# Altium footprint library Package_DFN_QFN.PcbLib: 557 footprints (part 35 of 35)
Each footprint in its own frame and in the unit in brackets; x right, y up, seen from the top. Pads: shape width x height; smd on the part's side, far side on the other; paste and mask are expansions set on the pad; w line width, h text height; cw(c..) or ccw(c..) is an arc to the next point about the centre after c.
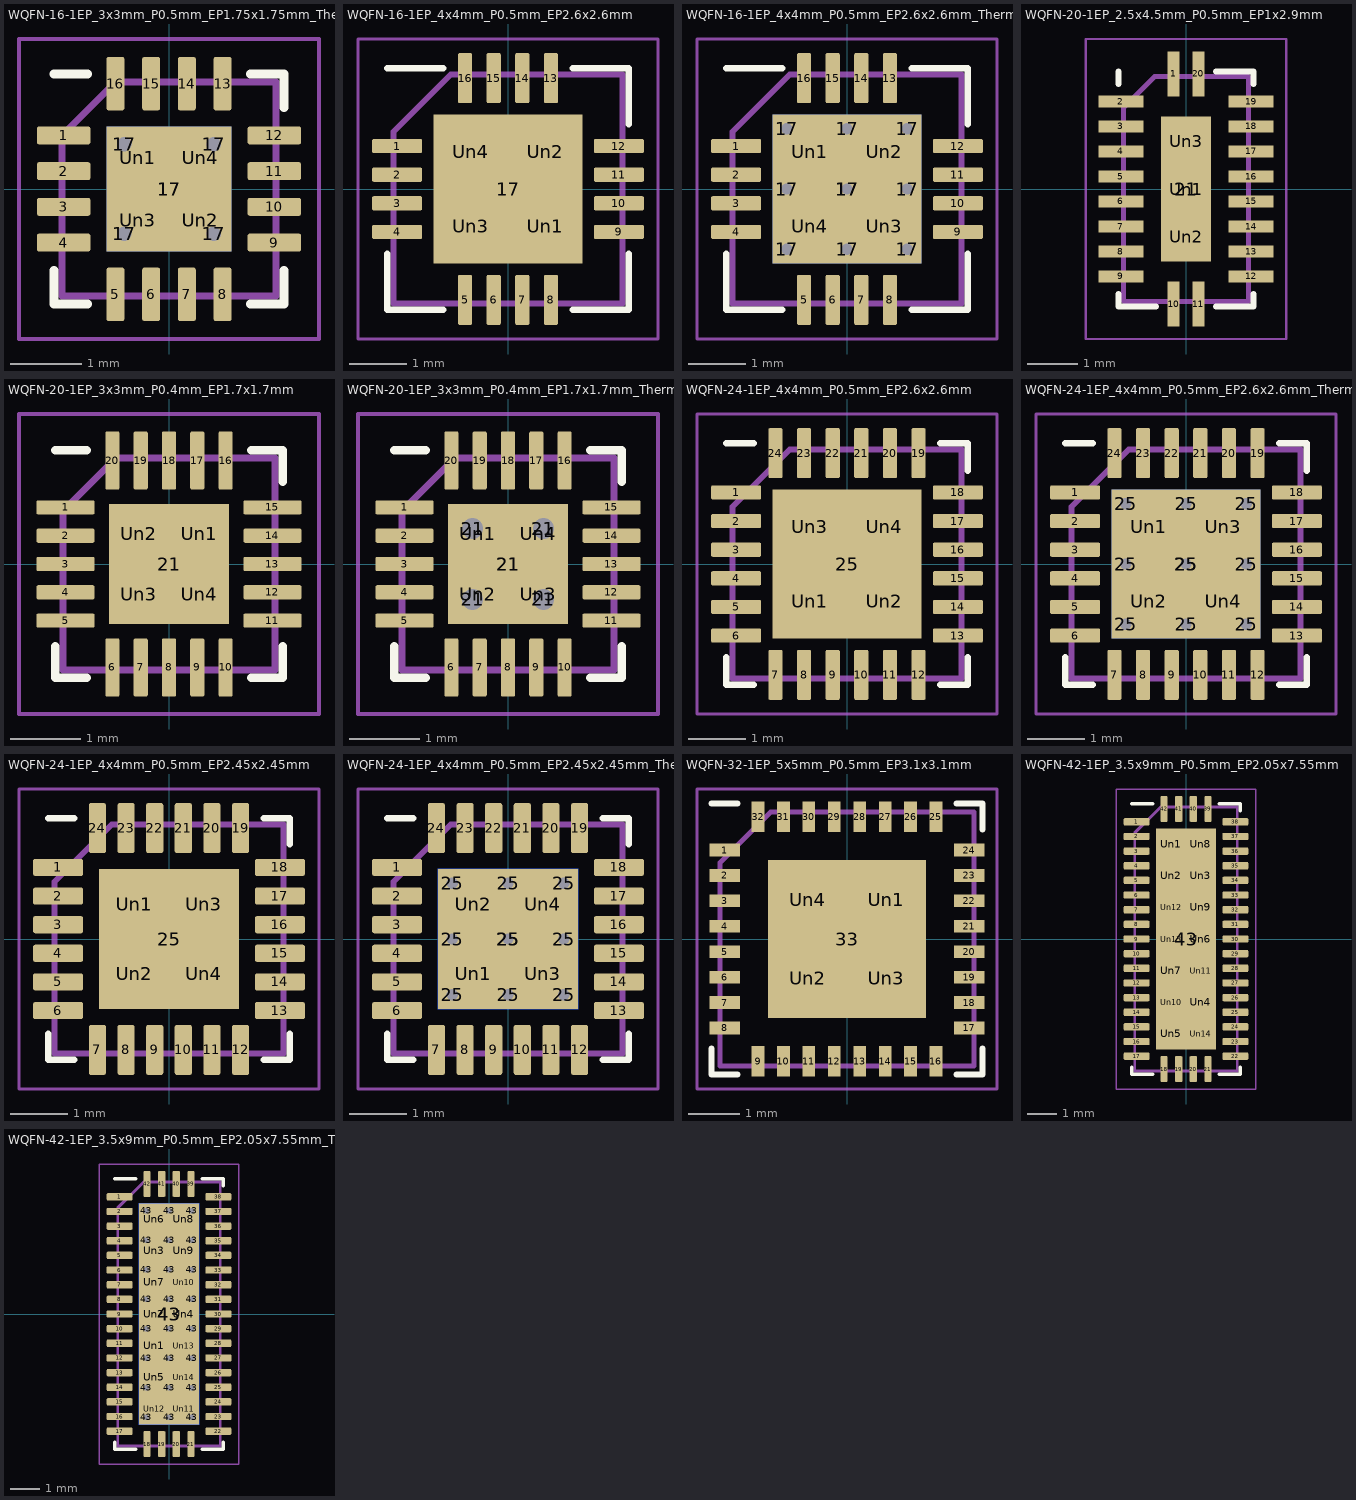
[diagram p34: the footprints below, top view; thin cyan lines are the x and y axes]

## WQFN-16-1EP_3x3mm_P0.5mm_EP1.75x1.75mm_ThermalVias [mm]
pads (26):
  rrect25% 0.75x0.25 smd: 1(-1.475,0.75) 2(-1.475,0.25) 3(-1.475,-0.25) 4(-1.475,-0.75) 9(1.475,-0.75) 10(1.475,-0.25) 11(1.475,0.25) 12(1.475,0.75)
  rrect25% 0.25x0.75 smd: 5(-0.75,-1.475) 6(-0.25,-1.475) 7(0.25,-1.475) 8(0.75,-1.475) 13(0.75,1.475) 14(0.25,1.475) 15(-0.25,1.475) 16(-0.75,1.475)
  round 0.5 hole 0.2: 17(-0.625,-0.625) 17(-0.625,0.625) 17(0.625,-0.625) 17(0.625,0.625)
  rect 1.75x1.75 smd: 17(0,0)
  rect 1.75x1.75 smd far side: 17(0,0)
  rrect25% 0.76x0.76 on Top Paste: Un1(-0.44,0.44) Un2(0.44,-0.44) Un3(-0.44,-0.44) Un4(0.44,0.44)
F.SilkS:
  lines w0.12: -1.61,-1.135 -1.61,-1.61 -1.135,-1.61 ; -1.61,1.61 -1.135,1.61 ; 1.135,-1.61 1.61,-1.61 1.61,-1.135 ; 1.135,1.61 1.61,1.61 1.61,1.135
F.CrtYd:
  lines w0.05: -2.1,-2.1 2.1,-2.1 2.1,2.1 -2.1,2.1 -2.1,-2.1
F.Fab:
  lines w0.1: -1.5,-1.5 1.5,-1.5 1.5,1.5 -0.75,1.5 -1.5,0.75 -1.5,-1.5
  text "'.Designator'" at -3.033,-0.628 h0.75

## WQFN-16-1EP_4x4mm_P0.5mm_EP2.6x2.6mm [mm]
pads (21):
  rrect25% 0.875x0.25 smd: 1(-1.937,0.75) 2(-1.937,0.25) 3(-1.937,-0.25) 4(-1.937,-0.75) 9(1.937,-0.75) 10(1.937,-0.25) 11(1.937,0.25) 12(1.937,0.75)
  rrect25% 0.25x0.875 smd: 5(-0.75,-1.937) 6(-0.25,-1.937) 7(0.25,-1.937) 8(0.75,-1.937) 13(0.75,1.937) 14(0.25,1.937) 15(-0.25,1.937) 16(-0.75,1.937)
  rect 2.6x2.6 smd: 17(0,0)
  rrect24% 1.05x1.05 on Top Paste: Un1(0.65,-0.65) Un2(0.65,0.65) Un3(-0.65,-0.65) Un4(-0.65,0.65)
F.SilkS:
  lines w0.12: -2.11,-1.135 -2.11,-2.11 -1.135,-2.11 ; -2.11,2.11 -1.135,2.11 ; 1.135,-2.11 2.11,-2.11 2.11,-1.135 ; 1.135,2.11 2.11,2.11 2.11,1.135
F.CrtYd:
  lines w0.05: -2.62,-2.62 -2.62,2.62 2.62,2.62 2.62,-2.62 -2.62,-2.62
F.Fab:
  lines w0.1: -2,-2 2,-2 2,2 -1,2 -2,1 -2,-2
  text "'.Designator'" at -4.047,-0.84 h1

## WQFN-16-1EP_4x4mm_P0.5mm_EP2.6x2.6mm_ThermalVias [mm]
pads (31):
  rrect25% 0.875x0.25 smd: 1(-1.937,0.75) 2(-1.937,0.25) 3(-1.937,-0.25) 4(-1.937,-0.75) 9(1.937,-0.75) 10(1.937,-0.25) 11(1.937,0.25) 12(1.937,0.75)
  rrect25% 0.25x0.875 smd: 5(-0.75,-1.937) 6(-0.25,-1.937) 7(0.25,-1.937) 8(0.75,-1.937) 13(0.75,1.937) 14(0.25,1.937) 15(-0.25,1.937) 16(-0.75,1.937)
  round 0.5 hole 0.2: 17(-1.05,-1.05) 17(-1.05,0) 17(-1.05,1.05) 17(0,-1.05) 17(0,0) 17(0,1.05) 17(1.05,-1.05) 17(1.05,0) 17(1.05,1.05)
  rect 2.6x2.6 smd far side: 17(0,0)
  rect 2.6x2.6 smd: 17(0,0)
  rrect22% 1.13x1.13 on Top Paste: Un1(-0.65,0.65) Un2(0.65,0.65) Un3(0.65,-0.65) Un4(-0.65,-0.65)
F.SilkS:
  lines w0.12: -2.11,-1.135 -2.11,-2.11 -1.135,-2.11 ; -2.11,2.11 -1.135,2.11 ; 1.135,-2.11 2.11,-2.11 2.11,-1.135 ; 1.135,2.11 2.11,2.11 2.11,1.135
F.CrtYd:
  lines w0.05: -2.62,-2.62 2.62,-2.62 2.62,2.62 -2.62,2.62 -2.62,-2.62
F.Fab:
  lines w0.1: -2,-2 2,-2 2,2 -1,2 -2,1 -2,-2
  text "'.Designator'" at -4.047,-0.84 h1

## WQFN-20-1EP_2.5x4.5mm_P0.5mm_EP1x2.9mm [mm]
pads (24):
  rect 0.24x0.9 smd: 1(-0.25,2.3) 10(-0.25,-2.3) 11(0.25,-2.3) 20(0.25,2.3)
  rect 0.9x0.24 smd: 2(-1.3,1.75) 3(-1.3,1.25) 4(-1.3,0.75) 5(-1.3,0.25) 6(-1.3,-0.25) 7(-1.3,-0.75) 8(-1.3,-1.25) 9(-1.3,-1.75) 12(1.3,-1.75) 13(1.3,-1.25) 14(1.3,-0.75) 15(1.3,-0.25) 16(1.3,0.25) 17(1.3,0.75) 18(1.3,1.25) 19(1.3,1.75)
  rect 1x2.9 smd: 21(0,0)
  rect 0.8x0.8 on Top Paste: Un1(0,0) Un2(0,-0.95) Un3(0,0.95)
F.SilkS:
  lines w0.12: -1.35,-2.1 -1.35,-2.35 -0.6,-2.35 ; -1.35,2.1 -1.35,2.35 ; 0.6,-2.35 1.35,-2.35 1.35,-2.1 ; 0.6,2.35 1.35,2.35 1.35,2.1
F.CrtYd:
  lines w0.05: -2,-3 -2,3 2,3 2,-3 -2,-3
F.Fab:
  lines w0.1: -1.25,-2.25 1.25,-2.25 1.25,2.25 -0.625,2.25 -1.25,1.625 -1.25,-2.25
  text "'.Designator'" at -1.619,-0.336 h0.4

## WQFN-20-1EP_3x3mm_P0.4mm_EP1.7x1.7mm [mm]
pads (25):
  rrect25% 0.825x0.2 smd: 1(-1.462,0.8) 2(-1.462,0.4) 3(-1.462,0) 4(-1.462,-0.4) 5(-1.462,-0.8) 11(1.462,-0.8) 12(1.462,-0.4) 13(1.462,0) 14(1.462,0.4) 15(1.462,0.8)
  rrect25% 0.2x0.825 smd: 6(-0.8,-1.462) 7(-0.4,-1.462) 8(0,-1.462) 9(0.4,-1.462) 10(0.8,-1.462) 16(0.8,1.462) 17(0.4,1.462) 18(0,1.462) 19(-0.4,1.462) 20(-0.8,1.462)
  rect 1.7x1.7 smd: 21(0,0)
  rrect25% 0.69x0.69 on Top Paste: Un1(0.425,0.425) Un2(-0.425,0.425) Un3(-0.425,-0.425) Un4(0.425,-0.425)
F.SilkS:
  lines w0.12: -1.61,-1.16 -1.61,-1.61 -1.16,-1.61 ; -1.61,1.61 -1.16,1.61 ; 1.16,-1.61 1.61,-1.61 1.61,-1.16 ; 1.16,1.61 1.61,1.61 1.61,1.16
F.CrtYd:
  lines w0.05: -2.12,-2.12 -2.12,2.12 2.12,2.12 2.12,-2.12 -2.12,-2.12
F.Fab:
  lines w0.1: -1.5,-1.5 1.5,-1.5 1.5,1.5 -0.75,1.5 -1.5,0.75 -1.5,-1.5
  text "'.Designator'" at -3.033,-0.628 h0.75

## WQFN-20-1EP_3x3mm_P0.4mm_EP1.7x1.7mm_ThermalVias [mm]
pads (30):
  rrect25% 0.825x0.2 smd: 1(-1.462,0.8) 2(-1.462,0.4) 3(-1.462,0) 4(-1.462,-0.4) 5(-1.462,-0.8) 11(1.462,-0.8) 12(1.462,-0.4) 13(1.462,0) 14(1.462,0.4) 15(1.462,0.8)
  rrect25% 0.2x0.825 smd: 6(-0.8,-1.462) 7(-0.4,-1.462) 8(0,-1.462) 9(0.4,-1.462) 10(0.8,-1.462) 16(0.8,1.462) 17(0.4,1.462) 18(0,1.462) 19(-0.4,1.462) 20(-0.8,1.462)
  round 0.6 hole 0.3: 21(-0.5,-0.5) 21(-0.5,0.5) 21(0.5,-0.5) 21(0.5,0.5)
  rect 1.6x1.6 smd far side: 21(0,0)
  rect 1.7x1.7 smd: 21(0,0)
  rrect25% 0.69x0.69 on Top Paste: Un1(-0.425,0.425) Un2(-0.425,-0.425) Un3(0.425,-0.425) Un4(0.425,0.425)
F.SilkS:
  lines w0.12: -1.61,-1.16 -1.61,-1.61 -1.16,-1.61 ; -1.61,1.61 -1.16,1.61 ; 1.16,-1.61 1.61,-1.61 1.61,-1.16 ; 1.16,1.61 1.61,1.61 1.61,1.16
F.CrtYd:
  lines w0.05: -2.12,-2.12 -2.12,2.12 2.12,2.12 2.12,-2.12 -2.12,-2.12
F.Fab:
  lines w0.1: -1.5,-1.5 1.5,-1.5 1.5,1.5 -0.75,1.5 -1.5,0.75 -1.5,-1.5
  text "'.Designator'" at -3.033,-0.628 h0.75

## WQFN-24-1EP_4x4mm_P0.5mm_EP2.6x2.6mm [mm]
pads (29):
  rrect25% 0.875x0.25 smd: 1(-1.937,1.25) 2(-1.937,0.75) 3(-1.937,0.25) 4(-1.937,-0.25) 5(-1.937,-0.75) 6(-1.937,-1.25) 13(1.937,-1.25) 14(1.937,-0.75) 15(1.937,-0.25) 16(1.937,0.25) 17(1.937,0.75) 18(1.937,1.25)
  rrect25% 0.25x0.875 smd: 7(-1.25,-1.937) 8(-0.75,-1.937) 9(-0.25,-1.937) 10(0.25,-1.937) 11(0.75,-1.937) 12(1.25,-1.937) 19(1.25,1.937) 20(0.75,1.937) 21(0.25,1.937) 22(-0.25,1.937) 23(-0.75,1.937) 24(-1.25,1.937)
  rect 2.6x2.6 smd: 25(0,0)
  rrect24% 1.05x1.05 on Top Paste: Un1(-0.65,-0.65) Un2(0.65,-0.65) Un3(-0.65,0.65) Un4(0.65,0.65)
F.SilkS:
  lines w0.12: -2.11,-1.635 -2.11,-2.11 -1.635,-2.11 ; -2.11,2.11 -1.635,2.11 ; 1.635,-2.11 2.11,-2.11 2.11,-1.635 ; 1.635,2.11 2.11,2.11 2.11,1.635
F.CrtYd:
  lines w0.05: -2.62,-2.62 2.62,-2.62 2.62,2.62 -2.62,2.62 -2.62,-2.62
F.Fab:
  lines w0.1: -2,-2 -2,1 -1,2 2,2 2,-2 -2,-2
  text "'.Designator'" at -4.047,-0.84 h1

## WQFN-24-1EP_4x4mm_P0.5mm_EP2.6x2.6mm_ThermalVias [mm]
pads (39):
  rrect25% 0.875x0.25 smd: 1(-1.937,1.25) 2(-1.937,0.75) 3(-1.937,0.25) 4(-1.937,-0.25) 5(-1.937,-0.75) 6(-1.937,-1.25) 13(1.937,-1.25) 14(1.937,-0.75) 15(1.937,-0.25) 16(1.937,0.25) 17(1.937,0.75) 18(1.937,1.25)
  rrect25% 0.25x0.875 smd: 7(-1.25,-1.937) 8(-0.75,-1.937) 9(-0.25,-1.937) 10(0.25,-1.937) 11(0.75,-1.937) 12(1.25,-1.937) 19(1.25,1.937) 20(0.75,1.937) 21(0.25,1.937) 22(-0.25,1.937) 23(-0.75,1.937) 24(-1.25,1.937)
  round 0.5 hole 0.2: 25(-1.05,-1.05) 25(-1.05,0) 25(-1.05,1.05) 25(0,-1.05) 25(0,0) 25(0,1.05) 25(1.05,-1.05) 25(1.05,0) 25(1.05,1.05)
  rect 2.6x2.6 smd: 25(0,0)
  rect 2.6x2.6 smd far side: 25(0,0)
  rrect22% 1.13x1.13 on Top Paste: Un1(-0.65,0.65) Un2(-0.65,-0.65) Un3(0.65,0.65) Un4(0.65,-0.65)
F.SilkS:
  lines w0.12: -2.11,-1.635 -2.11,-2.11 -1.635,-2.11 ; -2.11,2.11 -1.635,2.11 ; 1.635,-2.11 2.11,-2.11 2.11,-1.635 ; 1.635,2.11 2.11,2.11 2.11,1.635
F.CrtYd:
  lines w0.05: -2.62,-2.62 2.62,-2.62 2.62,2.62 -2.62,2.62 -2.62,-2.62
F.Fab:
  lines w0.1: -2,-2 -2,1 -1,2 2,2 2,-2 -2,-2
  text "'.Designator'" at -4.047,-0.84 h1

## WQFN-24-1EP_4x4mm_P0.5mm_EP2.45x2.45mm [mm]
pads (29):
  rrect25% 0.875x0.3 smd: 1(-1.937,1.25) 2(-1.937,0.75) 3(-1.937,0.25) 4(-1.937,-0.25) 5(-1.937,-0.75) 6(-1.937,-1.25) 13(1.937,-1.25) 14(1.937,-0.75) 15(1.937,-0.25) 16(1.937,0.25) 17(1.937,0.75) 18(1.937,1.25)
  rrect25% 0.3x0.875 smd: 7(-1.25,-1.937) 8(-0.75,-1.937) 9(-0.25,-1.937) 10(0.25,-1.937) 11(0.75,-1.937) 12(1.25,-1.937) 19(1.25,1.937) 20(0.75,1.937) 21(0.25,1.937) 22(-0.25,1.937) 23(-0.75,1.937) 24(-1.25,1.937)
  rect 2.45x2.45 smd: 25(0,0)
  rrect25% 0.99x0.99 on Top Paste: Un1(-0.61,0.61) Un2(-0.61,-0.61) Un3(0.61,0.61) Un4(0.61,-0.61)
F.SilkS:
  lines w0.12: -2.11,-1.66 -2.11,-2.11 -1.66,-2.11 ; -2.11,2.11 -1.66,2.11 ; 1.66,-2.11 2.11,-2.11 2.11,-1.66 ; 1.66,2.11 2.11,2.11 2.11,1.66
F.CrtYd:
  lines w0.05: -2.62,-2.62 -2.62,2.62 2.62,2.62 2.62,-2.62 -2.62,-2.62
F.Fab:
  lines w0.1: -2,-2 -2,1 -1,2 2,2 2,-2 -2,-2
  text "'.Designator'" at -4.047,-0.84 h1

## WQFN-24-1EP_4x4mm_P0.5mm_EP2.45x2.45mm_ThermalVias [mm]
pads (39):
  rrect25% 0.875x0.3 smd: 1(-1.937,1.25) 2(-1.937,0.75) 3(-1.937,0.25) 4(-1.937,-0.25) 5(-1.937,-0.75) 6(-1.937,-1.25) 13(1.937,-1.25) 14(1.937,-0.75) 15(1.937,-0.25) 16(1.937,0.25) 17(1.937,0.75) 18(1.937,1.25)
  rrect25% 0.3x0.875 smd: 7(-1.25,-1.937) 8(-0.75,-1.937) 9(-0.25,-1.937) 10(0.25,-1.937) 11(0.75,-1.937) 12(1.25,-1.937) 19(1.25,1.937) 20(0.75,1.937) 21(0.25,1.937) 22(-0.25,1.937) 23(-0.75,1.937) 24(-1.25,1.937)
  round 0.5 hole 0.2: 25(-0.975,-0.975) 25(-0.975,0) 25(-0.975,0.975) 25(0,-0.975) 25(0,0) 25(0,0.975) 25(0.975,-0.975) 25(0.975,0) 25(0.975,0.975)
  rect 2.45x2.45 smd: 25(0,0)
  rect 2.45x2.45 smd far side: 25(0,0)
  rrect24% 1.06x1.06 on Top Paste: Un1(-0.61,-0.61) Un2(-0.61,0.61) Un3(0.61,-0.61) Un4(0.61,0.61)
F.SilkS:
  lines w0.12: -2.11,-1.66 -2.11,-2.11 -1.66,-2.11 ; -2.11,2.11 -1.66,2.11 ; 1.66,-2.11 2.11,-2.11 2.11,-1.66 ; 1.66,2.11 2.11,2.11 2.11,1.66
F.CrtYd:
  lines w0.05: -2.62,-2.62 2.62,-2.62 2.62,2.62 -2.62,2.62 -2.62,-2.62
F.Fab:
  lines w0.1: -2,-2 2,-2 2,2 -1,2 -2,1 -2,-2
  text "'.Designator'" at -4.047,-0.84 h1

## WQFN-32-1EP_5x5mm_P0.5mm_EP3.1x3.1mm [mm]
pads (37):
  rect 0.6x0.25 smd: 1(-2.4,1.75) 2(-2.4,1.25) 3(-2.4,0.75) 4(-2.4,0.25) 5(-2.4,-0.25) 6(-2.4,-0.75) 7(-2.4,-1.25) 8(-2.4,-1.75) 17(2.4,-1.75) 18(2.4,-1.25) 19(2.4,-0.75) 20(2.4,-0.25) 21(2.4,0.25) 22(2.4,0.75) 23(2.4,1.25) 24(2.4,1.75)
  rect 0.25x0.6 smd: 9(-1.75,-2.4) 10(-1.25,-2.4) 11(-0.75,-2.4) 12(-0.25,-2.4) 13(0.25,-2.4) 14(0.75,-2.4) 15(1.25,-2.4) 16(1.75,-2.4) 25(1.75,2.4) 26(1.25,2.4) 27(0.75,2.4) 28(0.25,2.4) 29(-0.25,2.4) 30(-0.75,2.4) 31(-1.25,2.4) 32(-1.75,2.4)
  rect 3.1x3.1 smd: 33(0,0)
  rect 1.23x1.23 on Top Paste: Un1(0.775,0.775) Un2(-0.775,-0.775) Un3(0.775,-0.775) Un4(-0.775,0.775)
F.SilkS:
  lines w0.12: -2.667,-2.159 -2.667,-2.667 -2.159,-2.667 ; -2.667,2.667 -2.159,2.667 ; 2.159,-2.667 2.667,-2.667 2.667,-2.159 ; 2.159,2.667 2.667,2.667 2.667,2.159
F.CrtYd:
  lines w0.05: -2.95,-2.95 2.95,-2.95 2.95,2.95 -2.95,2.95 -2.95,-2.95
F.Fab:
  lines w0.1: -2.5,-2.5 -2.5,1.5 -1.5,2.5 2.5,2.5 2.5,-2.5 -2.5,-2.5
  text "'.Designator'" at -4.047,-0.84 h1

## WQFN-42-1EP_3.5x9mm_P0.5mm_EP2.05x7.55mm [mm]
pads (57):
  rrect25% 0.875x0.25 smd: 1(-1.687,4) 2(-1.687,3.5) 3(-1.687,3) 4(-1.687,2.5) 5(-1.687,2) 6(-1.687,1.5) 7(-1.687,1) 8(-1.687,0.5) 9(-1.687,0) 10(-1.687,-0.5) 11(-1.687,-1) 12(-1.687,-1.5) 13(-1.687,-2) 14(-1.687,-2.5) 15(-1.687,-3) 16(-1.687,-3.5) 17(-1.687,-4) 22(1.687,-4) 23(1.687,-3.5) 24(1.687,-3) 25(1.687,-2.5) 26(1.687,-2) 27(1.687,-1.5) 28(1.687,-1) 29(1.687,-0.5) 30(1.687,0) 31(1.687,0.5) 32(1.687,1) 33(1.687,1.5) 34(1.687,2) 35(1.687,2.5) 36(1.687,3) 37(1.687,3.5) 38(1.687,4)
  rrect25% 0.25x0.875 smd: 18(-0.75,-4.437) 19(-0.25,-4.437) 20(0.25,-4.437) 21(0.75,-4.437) 39(0.75,4.437) 40(0.25,4.437) 41(-0.25,4.437) 42(-0.75,4.437)
  rect 2.05x7.55 smd: 43(0,0)
  rrect25% 0.83x0.87 on Top Paste: Un1(-0.51,3.24) Un2(-0.51,2.16) Un3(0.51,2.16) Un4(0.51,-2.16) Un5(-0.51,-3.24) Un6(0.51,0) Un7(-0.51,-1.08) Un8(0.51,3.24) Un9(0.51,1.08) Un10(-0.51,-2.16) Un11(0.51,-1.08) Un12(-0.51,1.08) Un13(-0.51,0) Un14(0.51,-3.24)
F.SilkS:
  lines w0.12: -1.86,-4.385 -1.86,-4.61 -1.135,-4.61 ; -1.86,4.61 -1.135,4.61 ; 1.135,-4.61 1.86,-4.61 1.86,-4.385 ; 1.135,4.61 1.86,4.61 1.86,4.385
F.CrtYd:
  lines w0.05: -2.38,-5.12 2.38,-5.12 2.38,5.12 -2.38,5.12 -2.38,-5.12
F.Fab:
  lines w0.1: -1.75,-4.5 -1.75,3.625 -0.875,4.5 1.75,4.5 1.75,-4.5 -1.75,-4.5
  text "'.Designator'" at -3.559,-0.737 h0.88

## WQFN-42-1EP_3.5x9mm_P0.5mm_EP2.05x7.55mm_ThermalVias [mm]
pads (82):
  rrect25% 0.875x0.25 smd: 1(-1.687,4) 2(-1.687,3.5) 3(-1.687,3) 4(-1.687,2.5) 5(-1.687,2) 6(-1.687,1.5) 7(-1.687,1) 8(-1.687,0.5) 9(-1.687,0) 10(-1.687,-0.5) 11(-1.687,-1) 12(-1.687,-1.5) 13(-1.687,-2) 14(-1.687,-2.5) 15(-1.687,-3) 16(-1.687,-3.5) 17(-1.687,-4) 22(1.687,-4) 23(1.687,-3.5) 24(1.687,-3) 25(1.687,-2.5) 26(1.687,-2) 27(1.687,-1.5) 28(1.687,-1) 29(1.687,-0.5) 30(1.687,0) 31(1.687,0.5) 32(1.687,1) 33(1.687,1.5) 34(1.687,2) 35(1.687,2.5) 36(1.687,3) 37(1.687,3.5) 38(1.687,4)
  rrect25% 0.25x0.875 smd: 18(-0.75,-4.437) 19(-0.25,-4.437) 20(0.25,-4.437) 21(0.75,-4.437) 39(0.75,4.437) 40(0.25,4.437) 41(-0.25,4.437) 42(-0.75,4.437)
  round 0.5 hole 0.2: 43(-0.775,-3.525) 43(-0.775,-2.518) 43(-0.775,-1.511) 43(-0.775,-0.504) 43(-0.775,0.504) 43(-0.775,1.511) 43(-0.775,2.518) 43(-0.775,3.525) 43(0,-3.525) 43(0,-2.518) 43(0,-1.511) 43(0,-0.504) 43(0,0.504) 43(0,1.511) 43(0,2.518) 43(0,3.525) 43(0.775,-3.525) 43(0.775,-2.518) 43(0.775,-1.511) 43(0.775,-0.504) 43(0.775,0.504) 43(0.775,1.511) 43(0.775,2.518) 43(0.775,3.525)
  rect 2.05x7.55 smd far side: 43(0,0)
  rect 2.05x7.55 smd: 43(0,0)
  rrect25% 0.83x0.87 on Top Paste: Un1(-0.51,-1.08) Un2(-0.51,0) Un3(-0.51,2.16) Un4(0.51,0) Un5(-0.51,-2.16) Un6(-0.51,3.24) Un7(-0.51,1.08) Un8(0.51,3.24) Un9(0.51,2.16) Un10(0.51,1.08) Un11(0.51,-3.24) Un12(-0.51,-3.24) Un13(0.51,-1.08) Un14(0.51,-2.16)
F.SilkS:
  lines w0.12: -1.86,-4.385 -1.86,-4.61 -1.135,-4.61 ; -1.86,4.61 -1.135,4.61 ; 1.135,-4.61 1.86,-4.61 1.86,-4.385 ; 1.135,4.61 1.86,4.61 1.86,4.385
F.CrtYd:
  lines w0.05: -2.38,-5.12 -2.38,5.12 2.38,5.12 2.38,-5.12 -2.38,-5.12
F.Fab:
  lines w0.1: -1.75,-4.5 -1.75,3.625 -0.875,4.5 1.75,4.5 1.75,-4.5 -1.75,-4.5
  text "'.Designator'" at -3.559,-0.737 h0.88